# Altium footprint library Cty1.PcbLib: 1378 footprints (part 14 of 87)
Each footprint in its own frame and in the unit in brackets; x right, y up, seen from the top. Pads: shape width x height; smd on the part's side, far side on the other; paste and mask are expansions set on the pad; w line width, h text height; cw(c..) or ccw(c..) is an arc to the next point about the centre after c.
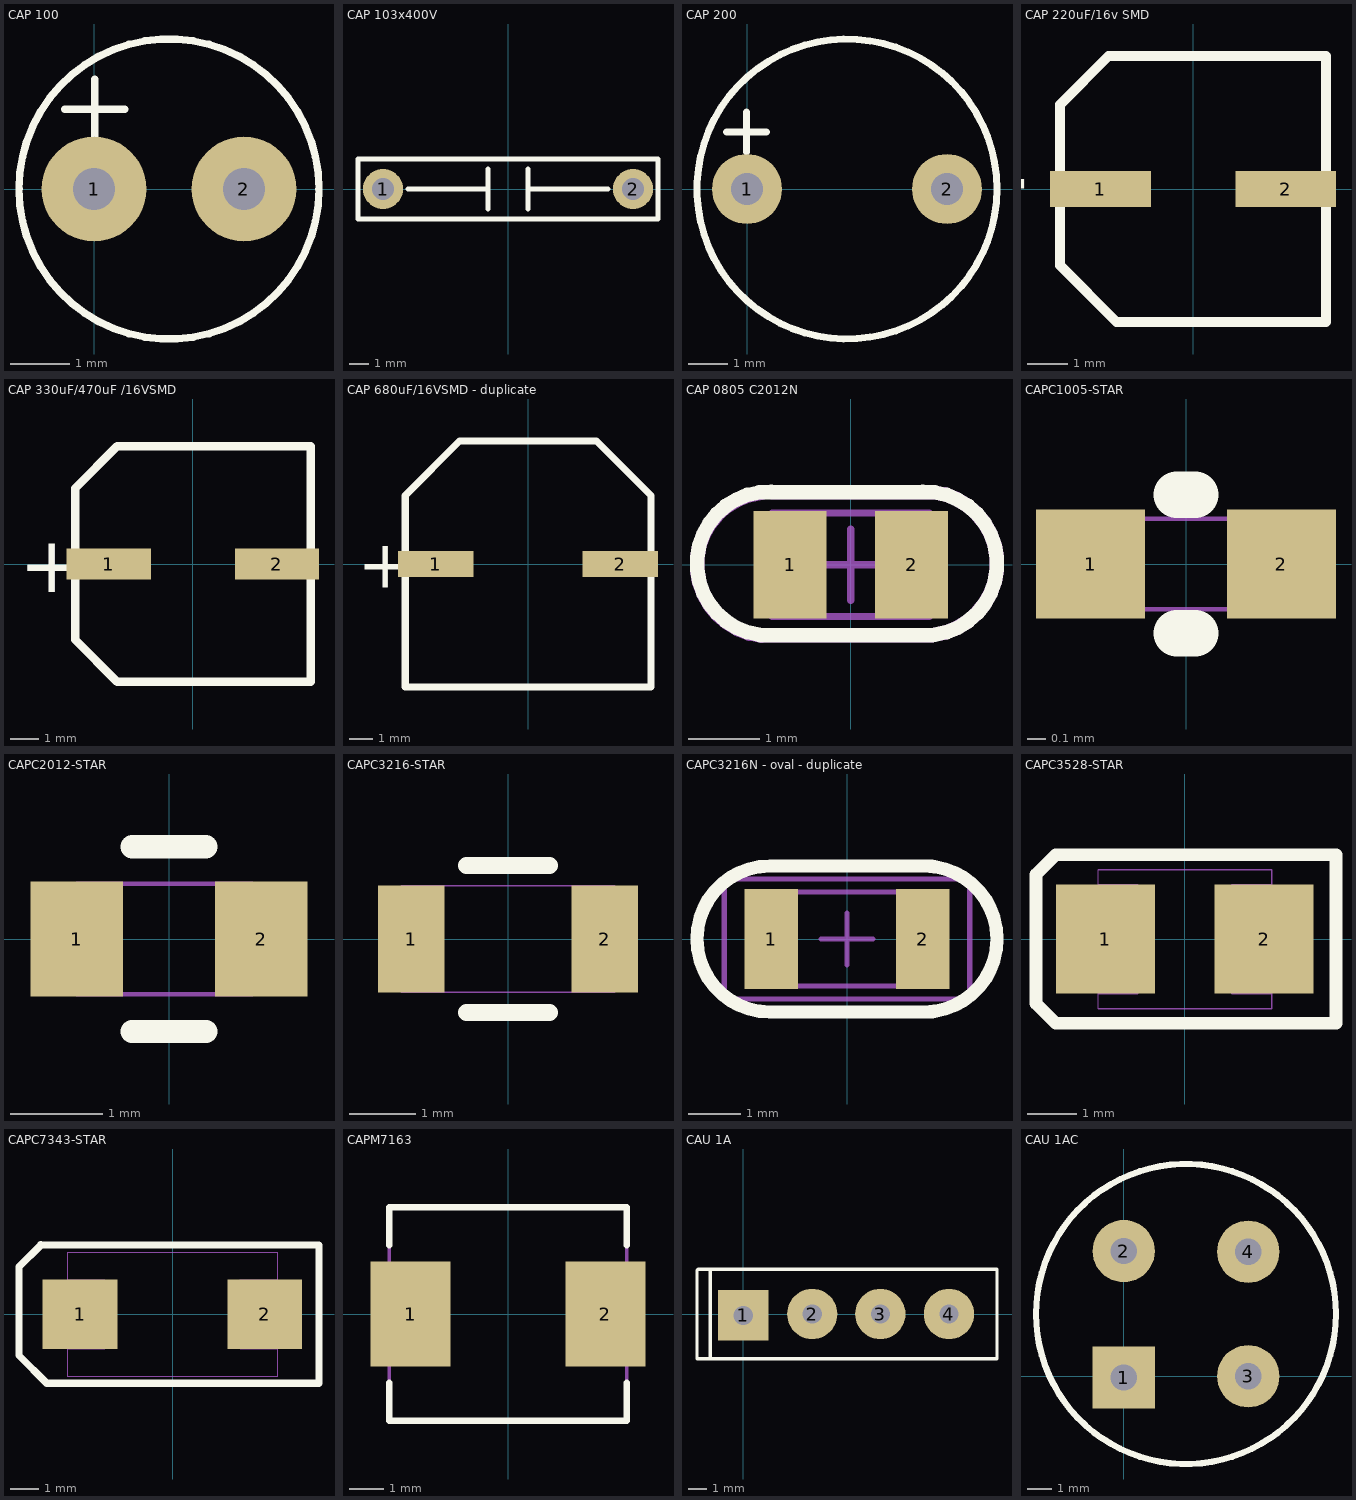
[diagram p13: the footprints below, top view; thin cyan lines are the x and y axes]

## CAP 100 [mil]
pads (2):
  round 70 hole 28 unplated: 1(0,0) 2(100,0)
Top Overlay:
  circle w5: c50,0 r100
  lines w5: -19.5,53.25 20.5,53.25 ; 0.5,33.25 0.5,73.25

## CAP 103x400V [mil] "Capacitor, tu khong phan cuc 103 400V"
pads (2):
  round 80 hole 43.31: 1(-250,0) 2(250,0)
Top Overlay:
  lines w10: -200,0 -40,0 ; -40,-40 -40,40 ; 40,-40 40,40 ; 40,0 200,0 ; -300,-60 -300,60 300,60 300,-60 -300,-60
3D body "SW3dPS-Cap 10n - 630V Poly_2009.STEP": height 430, standoff -118.11, extent -240.98,-100 260.98,87.05

## CAP 200 [mil]
pads (2):
  round 70 hole 32 unplated: 1(0,0) 2(200,0)
Top Overlay:
  circle w7: c100,0 r150
  lines w7: -20.5,57 19.5,57 ; -0.5,37 -0.5,77

## CAP 220uF/16v SMD [mm] "TU SMD"
pads (2):
  rect 2.5x0.9 smd: 1(-2.3,0) 2(2.3,0)
Top Overlay:
  lines w0.25: -3.3,-1.9 -1.9,-3.3 3.3,-3.3 3.3,3.3 -2.1,3.3 -3.3,2.1 -3.3,-1.9
  text "+" at -3.9,1 h2.03
3D body "Part1.STEP": height 7.76, standoff 0.01, extent -3.542,-3.3 3.542,3.3

## CAP 330uF/470uF /16VSMD [mm] "TU SMD"
pads (2):
  rect 3x1.1 smd: 1(-3,0) 2(3,0)
Top Overlay:
  lines w0.3: -4.2,-2.7 -2.7,-4.2 4.2,-4.2 4.2,4.2 -2.7,4.2 -4.2,2.7 -4.2,-2.7
  text "+" at -6.2,-1 h2.03
3D body "Part2.STEP": height 10.73, standoff -0.04, extent -4.522,-4.15 4.522,4.15

## CAP 680uF/16VSMD - duplicate [mm] "TU SMD"
pads (2):
  rect 3.2x1.1 smd: 1(-3.9,0) 2(3.9,0)
Top Overlay:
  lines w0.3: -5.2,-5.2 -5.2,2.9 -2.9,5.2 2.9,5.2 5.2,2.9 5.2,-5.2 -5.2,-5.2
  text "+" at -7.2,-1 h2.03

## CAP 0805 C2012N [mm] "Chip Capacitor, Body 2.0x1.3mm, IPC Medium Density"
height 1.1
pads (2):
  rect 1.017x1.5 smd: 1(-0.85,0) 2(0.85,0)
Top Overlay:
  lines w0.203: -1.27,-0.984 1.143,-0.984 ; -1.27,1.016 1.143,1.016 ; -1.11,-0.988 cw(c-1.147,0.016) -1.11,1.021 ; 1.004,-0.988 ccw(c1.041,0.016) 1.005,1.02
Mechanical 13:
  lines w0.1: -1.1,-0.725 -1.1,0.725 1.1,0.725 1.1,-0.725 -1.1,-0.725
Mechanical 15:
  lines w0.1: -0.5,0 0.5,0 ; 0,-0.5 0,0.5
  lines w0.203: -1.27,-0.984 1.143,-0.984 ccw(c1.041,0.016) 1.143,1.016 -1.097,1.016 ; -1.248,-0.996 cw(c-1.147,0.004) -1.248,1.004
3D body "0805(2012M) Cap.step": height 0.79, standoff 0, extent -1.228,-0.589 1.28,0.656

## CAPC1005-STAR [mm]
pads (2):
  rect 0.6x0.6 smd: 1(-0.525,0) 2(0.525,0)
Top Overlay:
  lines w0.254: -0.051,-0.381 0.051,-0.381 ; -0.051,0.381 0.051,0.381
Mechanical 7:
  lines w0.025: -0.5,-0.25 -0.5,0.25 0.5,0.25 0.5,-0.25 -0.5,-0.25
  text ".Comment" at -0.475,-0.2 h0.14
  text ".Designator" at -0.475,0.075 h0.14
3D body: height 0.4, standoff 0.05, extent -0.571,-0.301 -0.228,0.299
3D body: height 0.4, standoff 0.05, extent 0.23,-0.3 0.573,0.3
3D body: height 0.4, standoff 0.05, extent -0.233,-0.299 0.236,0.301

## CAPC2012-STAR [mm]
pads (2):
  rect 1x1.25 smd: 1(-1,0) 2(1,0)
Top Overlay:
  lines w0.25: -0.4,-1 0.4,-1
  lines w0.254: -0.4,1 0.4,1
Mechanical 7:
  lines w0.05: -1,-0.6 -1,0.6 0.9,0.6 0.9,-0.6 -1,-0.6
  text ".Designator" at -0.9,0.15 h0.4
  text ".Comment" at -0.9,-0.475 h0.4
3D body: height 0.8, standoff 0, extent -0.528,-0.615 0.435,0.6
3D body: height 0.8, standoff 0, extent 0.435,-0.642 0.867,0.6
3D body: height 0.8, standoff 0, extent -0.978,-0.615 -0.528,0.6

## CAPC3216-STAR [mm]
pads (2):
  rect 1x1.6 smd: 1(-1.45,0) 2(1.45,0)
Top Overlay:
  lines w0.254: -0.625,-1.1 0.625,-1.1 ; -0.625,1.1 0.625,1.1
Mechanical 7:
  lines w0.025: -1.6,-0.8 -1.6,0.8 1.6,0.8 1.6,-0.8 -1.6,-0.8
  text ".Designator" at -1.5,0.4 h0.4
  text ".Comment" at -1.5,-0.7 h0.4
3D body: height 0.9, standoff 0, extent -0.618,-0.849 0.675,0.858
3D body: height 0.9, standoff 0, extent 0.67,-0.867 1.632,0.858
3D body: height 0.9, standoff 0, extent -1.636,-0.893 -0.618,0.84

## CAPC3216N - oval - duplicate [mm]
pads (2):
  rect 1.016x1.905 smd: 1(-1.45,0) 2(1.45,0)
Top Overlay:
  lines w0.254: -1.477,-1.397 1.637,-1.397 ; -1.473,-1.397 cw(c-1.473,0) -1.473,1.397 ; -1.427,1.397 1.621,1.397 ; 1.473,-1.397 ccw(c1.473,0) 1.473,1.397
Mechanical 13:
  lines w0.1: -1.7,-0.9 1.7,-0.9 1.7,0.9 -1.7,0.9 -1.7,-0.9
Mechanical 15:
  lines w0.1: -0.5,0 0.5,0 ; 0,-0.5 0,0.5 ; -2.35,-1.15 2.35,-1.15 2.35,1.15 -2.35,1.15 -2.35,-1.15
3D body "1206 SMD Capacitor.step": height 1, standoff 0, extent -1.64,-0.8 1.56,0.8

## CAPC3528-STAR [mm]
pads (2):
  rect 2x2.2 smd: 1(-1.6,0) 2(1.6,0)
Top Overlay:
  lines w0.254: -3,-1.3 -2.6,-1.7 3.05,-1.7 3.05,1.7 -2.6,1.7 -3,1.3 -3,-1.3
Mechanical 7:
  lines w0.025: -1.748,-1.404 1.752,-1.404 1.752,1.396 -1.748,1.396 ; -1.748,-1.104 -0.948,-1.104 -0.948,1.096 -1.748,1.096 ; -1.748,-1.404 -1.748,1.396 ; 1.752,-1.104 0.952,-1.104 0.952,1.096 1.752,1.096
  text ".Designator" at -1.8,1.8 h0.5
  text ".Comment" at -1.7,-2.2 h0.5
3D body: height 0.3, standoff 0, extent -1.793,-0.665 -1.568,0.824
3D body: height 0.3, standoff 0, extent 1.578,-0.658 1.803,0.768
3D body: height 1, standoff 0, extent -1.704,-1.539 1.763,1.537

## CAPC7343-STAR [mm]
pads (2):
  rect 2.6x2.4 smd: 1(-3.202,0.007) 2(3.198,0.007)
Top Overlay:
  lines w0.254: -4.575,2.4 -5.325,1.65 -5.325,-1.425 -4.362,-2.388 ; -4.572,2.413 5.08,2.406 ; -4.369,-2.388 5.08,-2.388 5.08,2.388
Mechanical 7:
  lines w0.025: -3.651,-1.192 -2.351,-1.192 -2.351,1.208 -3.651,1.208 ; 3.649,-1.192 2.349,-1.192 2.349,1.208 3.649,1.208 ; -3.651,-2.142 3.649,-2.142 3.649,2.158 -3.651,2.158 -3.651,-2.142
  text ".Designator" at -3.575,1.375 h0.6
  text ".Comment" at -3.575,-2.025 h0.6
3D body: height 4.05, standoff 3.9, extent -2.468,-2.017 -1.993,2.005
3D body: height 0.3, standoff 0, extent 3.308,-0.855 3.512,0.915
3D body: height 0.3, standoff 0, extent -3.487,-0.869 -3.392,0.82
3D body: height 4, standoff 0, extent -3.464,-2.032 3.481,2.039

## CAPM7163 [mm]
pads (2):
  rect 2.35x3.1 smd: 1(-2.875,0) 2(2.875,0)
Top Overlay:
  lines w0.2: -3.5,-2.025 -3.5,-3.15 0,-3.15 3.5,-3.15 3.5,-2.025 ; -3.5,2.025 -3.5,3.15 0,3.15 3.5,3.15 3.5,2.025
Mechanical 7:
  lines w0.1: -3.5,-3.15 -3.5,3.15 0,3.15 3.5,3.15 3.5,-3.15 0,-3.15 -3.5,-3.15
  text ".Designator" at -3.065,2.159 h0.8
  text ".Comment" at -3.048,-2.794 h0.8
3D body: height 0.5, standoff 0, extent 2.68,-0.709 3.201,0.819
3D body: height 0.5, standoff 0, extent -3.1,-0.742 -2.579,0.785
3D body: height 1.5, standoff 0, extent -3.018,-2.635 3.086,2.806

## CAU 1A [mil] "CAU 1A DET"
height 800
pads (4):
  rect 110x110 hole 42: 1(0,-2)
  round 110 hole 42: 2(151,1) 3(300,1) 4(450,1)
Top Overlay:
  lines w7: -72,-95 -72,99 ; -101,-97 555,-97 555,99 -99,99 -101,97 -101,-97
3D body "SW3dPS-KBPM.STEP": height 453.36, standoff -499.4, extent -61.99,-90 511.99,107.24

## CAU 1AC [mil] "CAU 1A TRON"
height 800
pads (4):
  rect 100x100 hole 42: 1(0,-2)
  round 100 hole 42: 2(0,201) 3(200,0) 4(200,200)
Top Overlay:
  circle w10: c100,100 r240.88